# Altium footprint library EMDC_Packages.PcbLib: 274 footprints (part 4 of 18)
Each footprint in its own frame and in the unit in brackets; x right, y up, seen from the top. Pads: shape width x height; smd on the part's side, far side on the other; paste and mask are expansions set on the pad; w line width, h text height; cw(c..) or ccw(c..) is an arc to the next point about the centre after c.
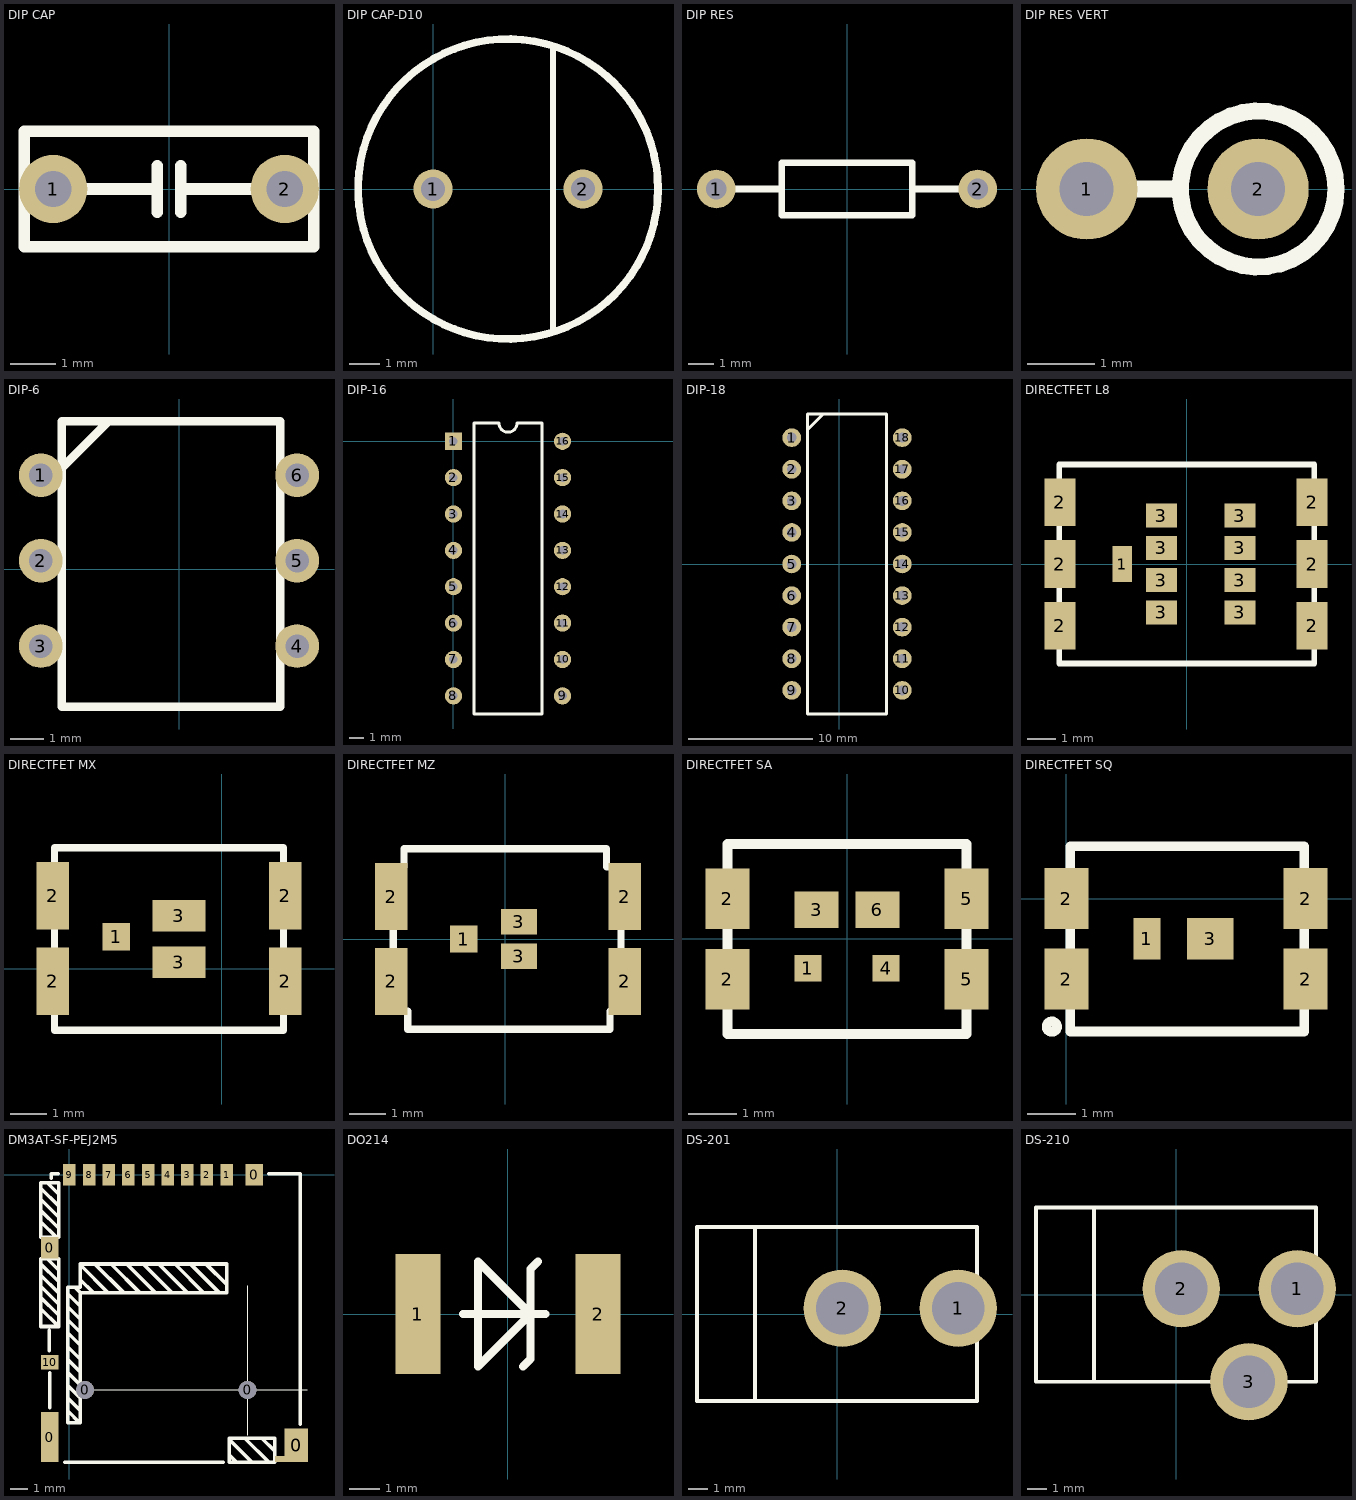
[diagram p3: the footprints below, top view; thin cyan lines are the x and y axes]

## DIP CAP [mm]
pads (2):
  round 1.5 hole 0.8: 1(-2.54,0) 2(2.54,0)
Top Overlay:
  lines w0.254: -2.54,0 -0.254,0 ; -0.254,-0.508 -0.254,0.508 ; 0.254,-0.508 0.254,0.508 ; 0.254,0 2.54,0 ; -3.175,-1.27 3.175,-1.27 3.175,1.27 -3.175,1.27 -3.175,-1.27

## DIP CAP-D10 [mm]
pads (2):
  round 1.3 hole 0.8: 1(0,0) 2(5,0)
Top Overlay:
  circle w0.254: c2.5,0 r5.004
  lines w0.2: 4,-4.7 4,4.7

## DIP RES [mm]
pads (2):
  round 1.5 hole 0.8: 1(-5.08,0) 2(5.08,0)
Top Overlay:
  lines w0.254: -5.08,0 -2.54,0 ; 2.54,0 5.08,0 ; -2.54,-1.016 2.54,-1.016 2.54,1.016 -2.54,1.016 -2.54,-1.016

## DIP RES VERT [mm]
pads (2):
  round 1.5 hole 0.8: 1(-5.08,0) 2(-2.54,0)
Top Overlay:
  circle w0.254: c-2.54,0 r1.154
  lines w0.254: -5.08,0 -3.75,0

## DIP-6 [mm]
pads (6):
  round 1.3 hole 0.7: 1(-4.12,2.79) 2(-4.12,0.25) 3(-4.12,-2.29) 4(3.5,-2.29) 5(3.5,0.25) 6(3.5,2.79)
Top Overlay:
  lines w0.254: -3.5,3 -2.1,4.4 ; -3.5,-4.1 3,-4.1 3,4.4 -3.5,4.4 -3.5,-4.1

## DIP-16 [mm]
pads (16):
  rect 1.2x1.2 hole 0.6: 1(0,0)
  round 1.2 hole 0.6: 2(0,-2.54) 3(0,-5.08) 4(0,-7.62) 5(0,-10.16) 6(0,-12.7) 7(0,-15.24) 8(0,-17.78) 9(7.62,-17.78) 10(7.62,-15.24) 11(7.62,-12.7) 12(7.62,-10.16) 13(7.62,-7.62) 14(7.62,-5.08) 15(7.62,-2.54) 16(7.62,0)
Top Overlay:
  lines w0.2: 1.435,-19.05 6.185,-19.05 6.185,1.27 4.445,1.27 cw(c3.81,1.27) 3.175,1.27 1.435,1.27 1.435,-19.05

## DIP-18 [mm]
pads (18):
  round 1.5 hole 0.8: 1(-3.81,10.16) 2(-3.81,7.62) 3(-3.81,5.08) 4(-3.81,2.54) 5(-3.81,0) 6(-3.81,-2.54) 7(-3.81,-5.08) 8(-3.81,-7.62) 9(-3.81,-10.16) 10(5.08,-10.16) 11(5.08,-7.62) 12(5.08,-5.08) 13(5.08,-2.54) 14(5.08,0) 15(5.08,2.54) 16(5.08,5.08) 17(5.08,7.62) 18(5.08,10.16)
Top Overlay:
  lines w0.254: -2.54,10.795 -1.27,12.065 ; -2.54,-12.065 -2.54,12.065 3.81,12.065 3.81,-12.065 -2.54,-12.065

## DIRECTFET L8 [mm]
pads (15):
  rect 0.7x1.3 smd: 1(-2.3,0)
  rect 1.1x1.7 smd: 2(-4.525,-2.2) 2(-4.525,0) 2(-4.525,2.2) 2(4.475,-2.2) 2(4.475,0) 2(4.475,2.2)
  rect 1.1x0.85 smd: 3(-0.9,-1.725) 3(-0.9,-0.575) 3(-0.9,0.575) 3(-0.9,1.725) 3(1.9,-1.725) 3(1.9,-0.575) 3(1.9,0.575) 3(1.9,1.725)
Top Overlay:
  lines w0.2: -4.55,-3.55 4.55,-3.55 4.55,3.55 -4.55,3.55 -4.55,-3.55
3D body "User Library-DirectFET-L8_AUIRF7669L2.STEP": height 0.83, standoff 0, extent -4.575,-3.55 4.575,3.55

## DIRECTFET MX [mm] "Nyashka"
pads (7):
  rect 0.75x0.75 smd: 1(-2.9,0.875)
  rect 0.9x1.85 smd: 2(-4.65,-0.35) 2(-4.65,2) 2(1.75,-0.35) 2(1.75,2)
  rect 1.45x0.87 smd: 3(-1.175,1.45) 3(-1.175,0.175)
Top Overlay:
  lines w0.2: -4.6,-1.7 -4.6,3.325 1.7,3.325 1.7,-1.7 -4.6,-1.7
3D body "User Library-DirectFET_MX.STEP": height 0.7, standoff -0.05, extent -4.6,-1.7 1.75,3.35

## DIRECTFET MZ [mm]
pads (7):
  rect 0.75x0.75 smd: 1(-1.15,0)
  rect 0.9x1.85 smd: 2(-3.15,-1.175) 2(-3.15,1.175) 2(3.3,-1.175) 2(3.3,1.175)
  rect 1x0.7 smd: 3(0.375,-0.475) 3(0.375,0.475)
Top Overlay:
  lines w0.2: -3.1,-2 -2.7,-2 -2.7,-2.5 2.9,-2.5 2.9,-2 3.2,-2 3.2,2 2.8,2 2.8,2.5 -2.8,2.5 -2.8,2 -3.1,2 -3.1,-2

## DIRECTFET SA [mm]
pads (8):
  rect 0.55x0.55 smd: 1(-0.8,-0.6) 4(0.8,-0.6)
  rect 0.9x1.25 smd: 2(-2.45,-0.825) 2(-2.45,0.825) 5(2.45,-0.825) 5(2.45,0.825)
  rect 0.9x0.75 smd: 3(-0.625,0.6) 6(0.625,0.6)
Top Overlay:
  lines w0.2: -2.45,-1.95 2.45,-1.95 2.45,1.95 -2.45,1.95 -2.45,-1.95

## DIRECTFET SQ [mm]
pads (6):
  rect 0.55x0.85 smd: 1(1.65,-0.825)
  rect 0.9x1.25 smd: 2(0,-1.65) 2(0,0) 2(4.9,-1.65) 2(4.9,0)
  rect 0.95x0.85 smd: 3(2.95,-0.825)
Top Overlay:
  circle w0.2: c-0.3,-2.625 r0.106
  lines w0.2: 0.075,-2.725 0.075,1.075 4.875,1.075 4.875,-2.725 0.075,-2.725
3D body "MG-WDSON-2_3.stp": height 0.66, standoff 0, extent 0.075,-2.738 4.875,1.088

## DM3AT-SF-PEJ2M5 [mm] "microSD card socket"
pads (17):
  rect 1x2.8 smd: 0(-1.1,-14.7)
  rect 1x1.2 smd: 0(-1.1,-4.1) 0(10.35,0)
  round 1 hole 1 unplated paste+0 mask+0.102: 0(0.875,-12.05) 0(9.975,-12.05)
  rect 0.55x0.35 smd: 0(11.775,-15.925)
  rect 1.3x1.9 smd: 0(12.7,-15.15)
  rect 0.7x1.2 smd: 1(8.8,0) 2(7.7,0) 3(6.6,0) 4(5.5,0) 5(4.4,0) 6(3.3,0) 7(2.2,0) 8(1.1,0) 9(0,0)
  rect 1x0.8 smd: 10(-1.1,-10.5)
Top Overlay:
  lines w0.01: 0.875,-12.05 1.725,-12.05 13.325,-12.05 ; 9.975,-14.6 9.975,-6.225
  lines w0.2: -1.6,-7.5 -0.625,-8.475 ; -1.6,-6.875 -0.625,-7.85 ; -1.6,-6.25 -0.625,-7.225 ; -1.6,-5.625 -0.625,-6.6 ; -1.6,-5 -0.625,-5.975 ; -1.6,-2.625 -0.725,-3.5 ; -1.6,-2 -0.625,-2.975 ; -1.6,-1.375 -0.625,-2.35 ; -1.6,-0.75 -0.625,-1.725 ; -1.575,-4.7 -1.6,-4.7 ; -1.25,-4.7 -0.6,-5.35 ; -1.25,-0.45 -0.6,-1.1 ; -1.125,-9.85 -1.125,-8.7 ; -1.1,-13.05 -1.1,-11.1 ; -1.025,-0.2 -1.025,0.05 -0.625,0.05 ; -0.6,-3.5 -0.6,-0.45 -1.6,-0.45 -1.6,-3.5 -0.725,-3.5 ; -0.275,-16.1 8.6,-16.1 ; -0.1,-13.225 0.575,-13.9 0.6,-13.9 ; -0.1,-12.5 0.6,-13.2 ; -0.1,-11.8 0.6,-12.5 ; -0.1,-11.075 0.6,-11.775 ; -0.1,-10.35 0.6,-11.05 ; -0.1,-9.625 0.6,-10.325 ; -0.1,-8.85 0.6,-9.55 ; -0.1,-8.125 0.6,-8.825 ; -0.1,-7.375 -0.1,-7.4 0.6,-8.1 ; -0.1,-6.625 -0.1,-6.675 0.6,-7.375 ; 0.25,-6.3 0.3,-6.3 0.6,-6.6 ; 1.325,-6.6 0.6,-5.875 ; 1.375,-5 1.425,-5 3.025,-6.6 ; 2.15,-6.6 0.6,-5.05 0.6,-5 ; 2.375,-5.05 3.925,-6.6 ; 3.2,-5 4.8,-6.6 ; 4.175,-5.05 5.725,-6.6 ; 5,-5 6.6,-6.6 ; 5.95,-5.05 7.5,-6.6 ; 6.775,-5 8.375,-6.6 ; 7.65,-5 8.8,-6.15 ; 8.95,-15.675 8.95,-15.7 9.325,-16.075 ; 9.775,-14.75 9.825,-14.75 11.175,-16.1 ; 10.225,-16.1 8.95,-14.825 8.95,-14.75 ; 10.725,-14.75 10.775,-14.75 11.5,-15.475 ; 11.15,0.05 12.925,0.05 12.925,-13.975 ; -1.6,-4.7 -1.6,-8.5 -0.6,-8.5 -0.6,-4.7 -1.6,-4.7 ; -0.725,-3.5 -0.725,-3.5 ; 0.6,-13.9 0.6,-6.6 ; 0.6,-13.9 -0.1,-13.9 -0.1,-6.3 0.6,-6.3 0.6,-5 ; 0.6,-6.6 8.8,-6.6 8.8,-5 0.6,-5 ; 0.6,-5.875 0.6,-5.875 ; 8.95,-14.75 8.95,-16.1 11.5,-16.1 11.5,-14.75 8.95,-14.75
3D body "DM3AT-SF-PEJ2M5.stp": height 1.68, standoff -0.5, extent -0.925,-16.1 12.925,0.05

## DO214 [mm] "Diode Body 6 x 4 mm (LxW typ)"
height 3.5
pads (2):
  rect 1.5x4 smd: 1(-3,0) 2(3,0)
Top Overlay:
  lines w0.254: -1.5,0 1.25,0 ; 0.5,-1.75 0.75,-1.5 0.75,1.5 1,1.75 ; -1,-1.75 0.75,0 -1,1.75 -1,-1.75
3D body "User Library-S1G-1.STEP": height 2.7, standoff 0, extent -2.8,-1.5 2.8,1.45

## DS-201 [mm]
pads (2):
  round 4 hole 2.7: 1(6.25,0.3) 2(0.25,0.3)
Top Overlay:
  lines w0.2: -4.25,-4.5 -4.25,4.5 -7.25,4.5 ; -7.25,4.5 -7.25,-4.5 7.225,-4.5 7.225,4.5 -7.25,4.5 ; 3.75,-4.5 3.75,-4.5
3D body "User Library-ds-210.STEP": height 11.1, standoff -4.3, extent -7.25,-5.05 7.25,4.5

## DS-210 [mm] "DS-210 power connector"
pads (3):
  round 4 hole 2.7: 1(6.25,0.3) 2(0.25,0.3) 3(3.75,-4.5)
Top Overlay:
  lines w0.2: -4.25,-4.5 -4.25,4.5 -7.25,4.5 ; -7.25,4.5 7.225,4.5 7.225,-4.5 -7.25,-4.5 -7.25,4.5 ; 3.75,-4.5 3.75,-4.5
3D body "User Library-ds-210.STEP": height 11.1, standoff -4.3, extent -7.25,-5.05 7.25,4.5